# Altium footprint library ESKDPcbLib.PcbLib: 608 footprints (part 7 of 38)
Each footprint in its own frame and in the unit in brackets; x right, y up, seen from the top. Pads: shape width x height; smd on the part's side, far side on the other; paste and mask are expansions set on the pad; w line width, h text height; cw(c..) or ccw(c..) is an arc to the next point about the centre after c.
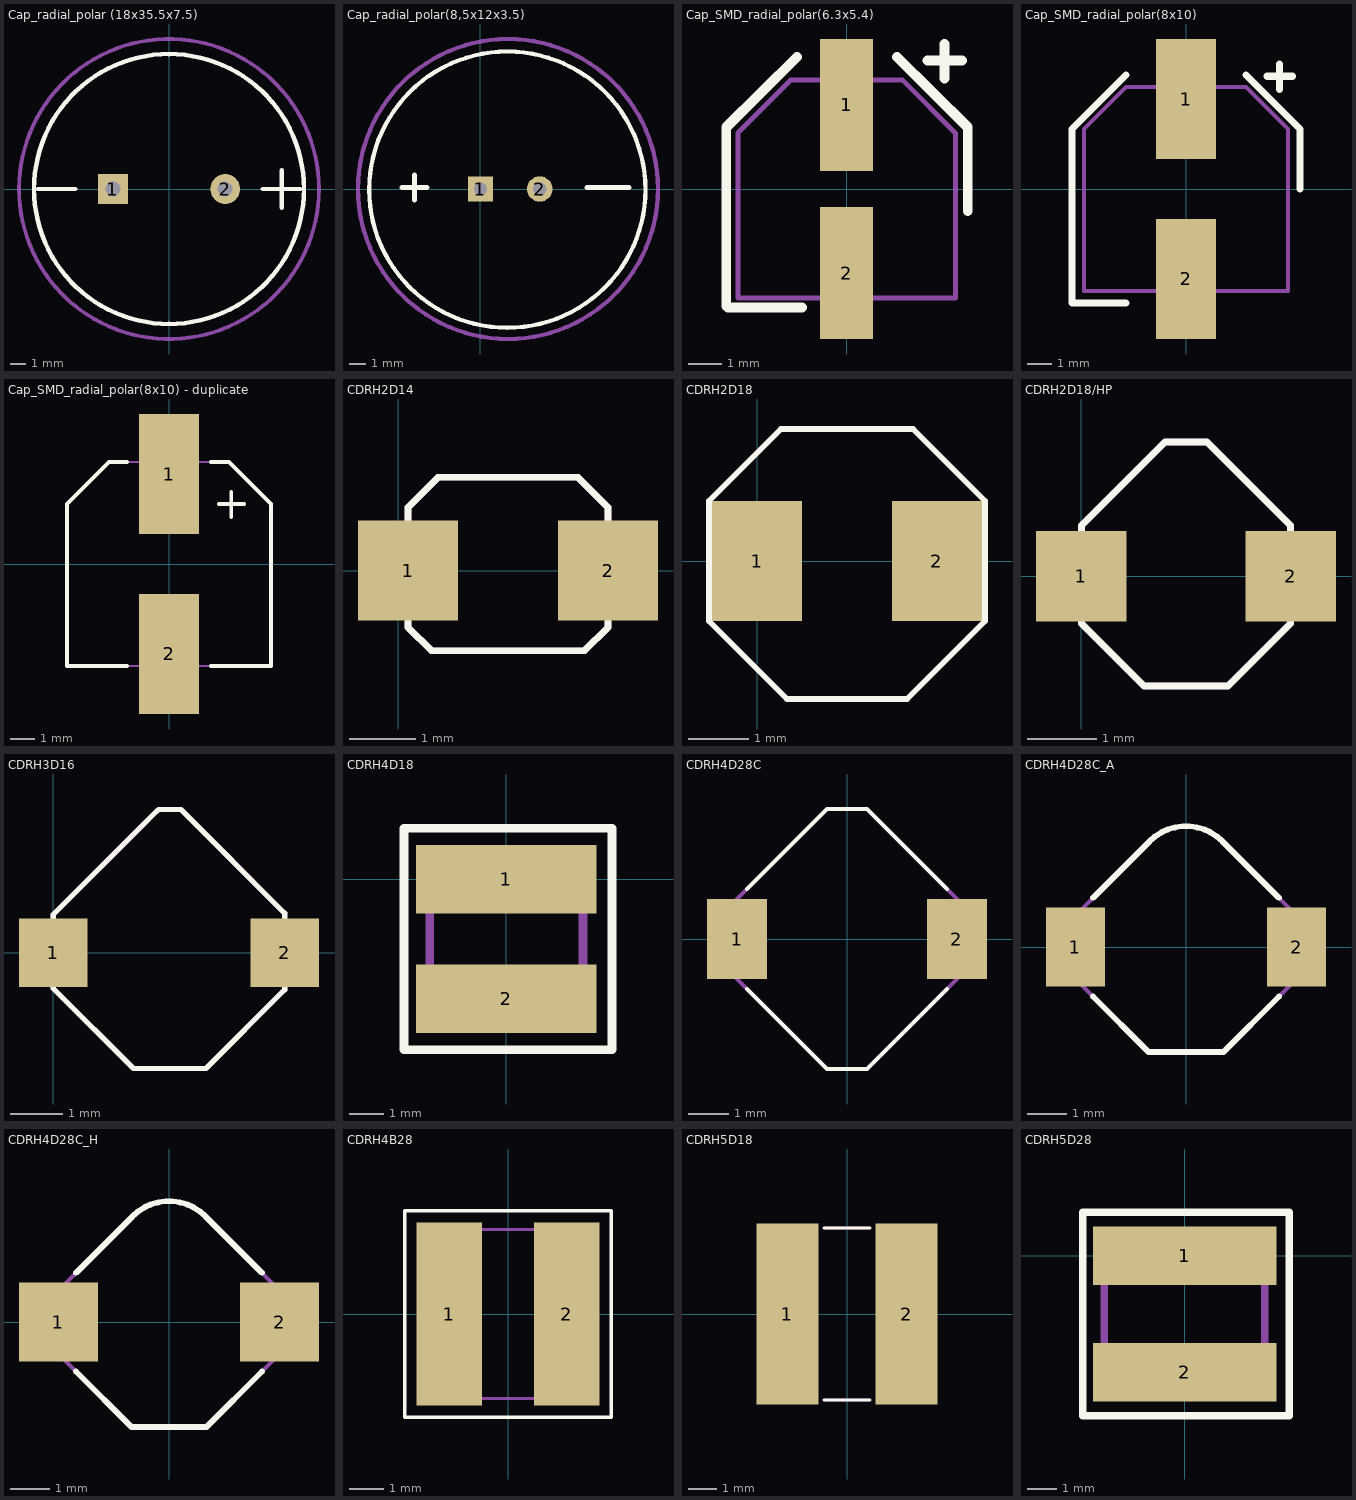
[diagram p6: the footprints below, top view; thin cyan lines are the x and y axes]

## Cap_radial_polar (18x35.5x7.5) [mm] "18x35.5x7.5"
height 35.5
pads (2):
  rect 2x2 hole 1: 1(-3.75,0)
  round 2 hole 1: 2(3.75,0)
Top Overlay:
  circle w0.3: c0,0 r9
  lines w0.3: -8.75,0 -6.25,0 ; 6.25,0 8.75,0 ; 7.5,-1.25 7.5,1.25
Mechanical 7:
  circle w0.254: c0,0 r10

## Cap_radial_polar(8,5x12x3.5) [mil] "8,5x12x3.5"
height 472.44
pads (2):
  rect 60x60 hole 31.5: 1(0,0)
  round 60 hole 31.5: 2(140,0)
Top Overlay:
  circle w10: c63.43,-1.57 r326.27
  lines w11.81: -185.04,3.94 -125.98,3.94 ; -155.51,-25.59 -155.51,33.46 ; 251.97,3.94 350.39,3.94
Mechanical 7:
  circle w10: c65,0 r354.33

## Cap_SMD_radial_polar(6.3x5.4) [mm] "6.5x5.4"
height 5.4
pads (2):
  rect 1.6x4 smd: 1(0,2.55) 2(0,-2.55)
Top Overlay:
  lines w0.3: -3.65,-3.55 -3.65,-3.05 -3.65,1.85 ; -3.65,1.875 -1.5,4 ; -3.6,-3.6 -1.35,-3.6 ; 1.525,4 3.675,1.875 ; 2.45,3.9 3.5,3.9 ; 2.975,3.35 2.975,4.4 ; 3.675,-0.675 3.675,1.85
Mechanical 7:
  lines w0.15: -3.3,-3.3 -3.3,1.7 -1.7,3.3 1.7,3.3 3.3,1.7 3.3,-3.3 -3.3,-3.3
3D body: height 5.4, standoff 0, extent -3.275,-3.5 3.325,3.5

## Cap_SMD_radial_polar(8x10) [mm] "8x10"
height 10
pads (2):
  rect 2.5x5 smd: 1(0,3.75) 2(0,-3.75)
Top Overlay:
  lines w0.3: -2.5,-4.75 -4.75,-4.75 -4.75,-4.25 -4.75,2.5 -2.5,4.75 ; 2.5,4.75 4.75,2.5 4.75,0 ; 3.375,4.7 4.425,4.7 ; 3.9,4.15 3.9,5.2
Mechanical 7:
  lines w0.15: -4.25,-4.25 4.25,-4.25 4.25,2.5 2.5,4.25 -2.5,4.25 -4.25,2.5 -4.25,-4.25
3D body: height 10.2, standoff 0, extent -4.15,-4.95 4.15,4.95

## Cap_SMD_radial_polar(8x10) - duplicate [mm] "8x10"
height 10
pads (2):
  rect 2.5x5 smd: 1(0,3.75) 2(0,-3.75)
Top Overlay:
  lines w0.15: -1.75,-4.25 -4.25,-4.25 -4.25,2.5 -2.5,4.25 -1.75,4.25 ; 1.75,-4.25 4.25,-4.25 4.25,2.5 2.5,4.25 1.75,4.25 ; 2.075,2.5 3.125,2.5 ; 2.6,1.95 2.6,3
Mechanical 7:
  lines w0.1: -4.25,-4.25 4.25,-4.25 4.25,2.5 2.5,4.25 -2.5,4.25 -4.25,2.5 -4.25,-4.25
Mechanical 10:
  text ".Comment" at -1.25,-0.5 h0.6
  text ".Designator" at -1.75,0.25 h0.8
3D body: height 10.2, standoff 0, extent -4.15,-4.95 4.15,4.95

## CDRH2D14 [mm]
pads (2):
  rect 1.5x1.5 smd mask+0: 1(0.15,0) 2(3.15,0)
Top Overlay:
  lines w0.1: 0.15,-0.85 0.5,-1.2 2.8,-1.2 3.15,-0.85 3.15,0.95 2.7,1.4 0.6,1.4 0.15,0.95 0.15,-0.85
Mechanical 7:
  lines w0.1: 0.15,-0.85 0.5,-1.2 2.8,-1.2 3.15,-0.85 3.15,0.95 2.7,1.4 0.6,1.4 0.15,0.95 0.15,-0.85

## CDRH2D18 [mm]
pads (2):
  rect 1.5x2 smd mask+0: 1(0,0) 2(3,0)
Top Overlay:
  lines w0.1: -0.8,-1 0.5,-2.3 2.5,-2.3 3.8,-1 3.8,1 2.6,2.2 0.4,2.2 -0.8,1 -0.8,-1
Mechanical 7:
  lines w0.1: -0.8,-1 -0.8,1 0.4,2.2 2.6,2.2 3.8,1 3.8,-1 2.5,-2.3 0.5,-2.3 -0.8,-1
Mechanical 10:
  text ".Designator" at -3.5,3.75 h0.8
  text ".Comment" at 1.5,-3.5 h0.6
3D body: height 2, standoff 0, extent -0.676,-2.175 3.676,2.176

## CDRH2D18/HP [mm]
height 2
pads (2):
  rect 1.3x1.3 smd: 1(0,0) 2(3,0)
Top Overlay:
  lines w0.1: 0,-0.675 0,0.725 1.2,1.925 1.8,1.925 3,0.725 3,0.65 3,-0.675 2.1,-1.575 0.9,-1.575 0,-0.675
Mechanical 7:
  lines w0.1: 0,-0.675 0.9,-1.575 2.1,-1.575 3,-0.675 3,0.65 3,0.725 1.8,1.925 1.2,1.925 0,0.725 0,-0.675
3D body: height 2, standoff 0, extent 0,-1.575 3,1.925

## CDRH3D16 [mm]
pads (2):
  rect 1.3x1.3 smd: 1(0,0) 2(4.4,0)
Top Overlay:
  lines w0.1: 1.975,2.7 0,0.725 0,-0.675 1.525,-2.2 2.9,-2.2 4.4,-0.7 ; 2,2.725 2.425,2.725 4.4,0.75 4.4,-0.675
Mechanical 7:
  lines w0.1: 1.8,2.525 0,0.725 0,-0.675 1.525,-2.2 2.9,-2.2 4.4,-0.7 ; 3.225,1.925 4.4,0.75 ; 4.4,-0.675 4.4,0.65
3D body: height 2, standoff 0, extent 0,-2.225 4.4,2.725

## CDRH4D18 [mm]
pads (2):
  rect 5.3x2 smd mask+0: 1(0,0) 2(0,-3.5)
Top Overlay:
  lines w0.254: -3,-5 -3,1.5 3.1,1.5 3.1,-5 -3,-5
Mechanical 7:
  lines w0.254: -2.25,-4 2.25,-4 2.25,0.5 -2.25,0.5 -2.25,-4

## CDRH4D28C [mm]
height 3
pads (2):
  rect 1.5x2 smd mask+0: 1(-2.75,0) 2(2.75,0)
Top Overlay:
  lines w0.1: -2.5,-1.25 -0.5,-3.25 0.5,-3.25 2.5,-1.25 ; -2.5,1.25 -0.5,3.25 0.5,3.25 2.5,1.25
Mechanical 7:
  lines w0.1: -3,-0.75 -3,0.75 -0.5,3.25 0,3.25 0.5,3.25 3,0.75 3,0.125 3,-0.125 3,-0.75 0.5,-3.25 -0.5,-3.25 -3,-0.75
Mechanical 10:
  text ".Designator" at -3.5,3.75 h0.8
  text ".Comment" at 1.5,-3.5 h0.6
3D body: height 3, standoff 0, extent -3,-3.25 3,3.25

## CDRH4D28C_A [mm]
height 3
pads (2):
  rect 1.5x2 smd: 1(-2.8,0) 2(2.8,0)
Top Overlay:
  lines w0.15: -2.356,-1.25 -0.955,-2.652 0.955,-2.652 2.356,-1.25 ; -2.353,1.253 -0.919,2.687 cw(c0,1.768) 0.919,2.687 2.353,1.253
Mechanical 7:
  lines w0.1: -2.899,-0.707 -2.899,0.707 -0.919,2.687 cw(c0,1.768) 0.919,2.687 2.899,0.707 2.899,-0.707 0.955,-2.652 -0.955,-2.652 -2.899,-0.707
Mechanical 10:
  text ".Designator" at -0.985,0.265 h0.8
  text ".Comment" at -0.985,-0.425 h0.6
3D body: height 3, standoff 0, extent -2.899,-2.652 2.899,2.687
3D body: height 3, standoff 0, extent -1.29,0.47 1.3,3.065

## CDRH4D28C_H [mm]
height 3
pads (2):
  rect 2x2 smd: 1(-2.8,0) 2(2.8,0)
Top Overlay:
  lines w0.15: -2.356,-1.25 -0.955,-2.652 0.955,-2.652 2.356,-1.25 ; -2.353,1.253 -0.919,2.687 cw(c0,1.768) 0.919,2.687 2.353,1.253
Mechanical 7:
  lines w0.1: -2.899,-0.707 -0.955,-2.652 0.955,-2.652 2.899,-0.707 2.899,0.707 0.919,2.687 ccw(c0,1.768) -0.919,2.687 -2.899,0.707 -2.899,-0.707
Mechanical 10:
  text ".Comment" at -0.985,-0.425 h0.6
  text ".Designator" at -0.985,0.265 h0.8
3D body: height 3, standoff 0, extent -1.29,0.47 1.3,3.065
3D body: height 3, standoff 0, extent -2.899,-2.652 2.899,2.687

## CDRH4В28 [mm]
pads (2):
  rect 1.9x5.3 smd: 1(-1.7,0) 2(1.7,0)
Top Overlay:
  lines w0.1: -3,-3 -3,2.5 -3,3 3,3 3,-3 -3,-3
Mechanical 7:
  lines w0.1: -2.45,-2.45 -2.45,2.45 2.45,2.45 2.45,-2.45 -2.45,-2.45
Mechanical 10:
  text ".Designator" at -2.25,5.5 h1.52
  text ".Comment" at -2.25,3.25 h1.52
3D body: height 2.91, standoff 0, extent -2.45,-2.45 2.45,2.45

## CDRH5D18 [mm]
pads (2):
  rect 2.15x6.3 smd: 1(-2.075,0) 2(2.075,0)
Top Overlay:
  lines w0.1: -0.8,-3 0.8,-3 ; -0.8,3 0.8,3
Mechanical 7:
  lines w0.1: -0.8,-3 0.8,-3 ; -0.8,3 0.8,3
Mechanical 10:
  text ".Comment" at -1.5,5.1 h1.52
  text ".Designator" at -1.6,3.7 h1.52
3D body: height 1.8, standoff 0, extent -3,-3 3,3

## CDRH5D28 [mm]
pads (2):
  rect 6.3x2 smd mask+0: 1(0,0) 2(0,-4)
Top Overlay:
  lines w0.254: -3.5,-5.5 -3.5,1.5 3.6,1.5 3.6,-5.5 -3.5,-5.5
Mechanical 7:
  lines w0.254: -2.75,-4.5 2.75,-4.5 2.75,0.5 -2.75,0.5 -2.75,-4.5
3D body: height 3, standoff 0, extent -3.5,-5.5 3.6,1.5